# Altium footprint library CI.PcbLib: 42 footprints (part 3 of 3)
Each footprint in its own frame and in the unit in brackets; x right, y up, seen from the top. Pads: shape width x height; smd on the part's side, far side on the other; paste and mask are expansions set on the pad; w line width, h text height; cw(c..) or ccw(c..) is an arc to the next point about the centre after c.
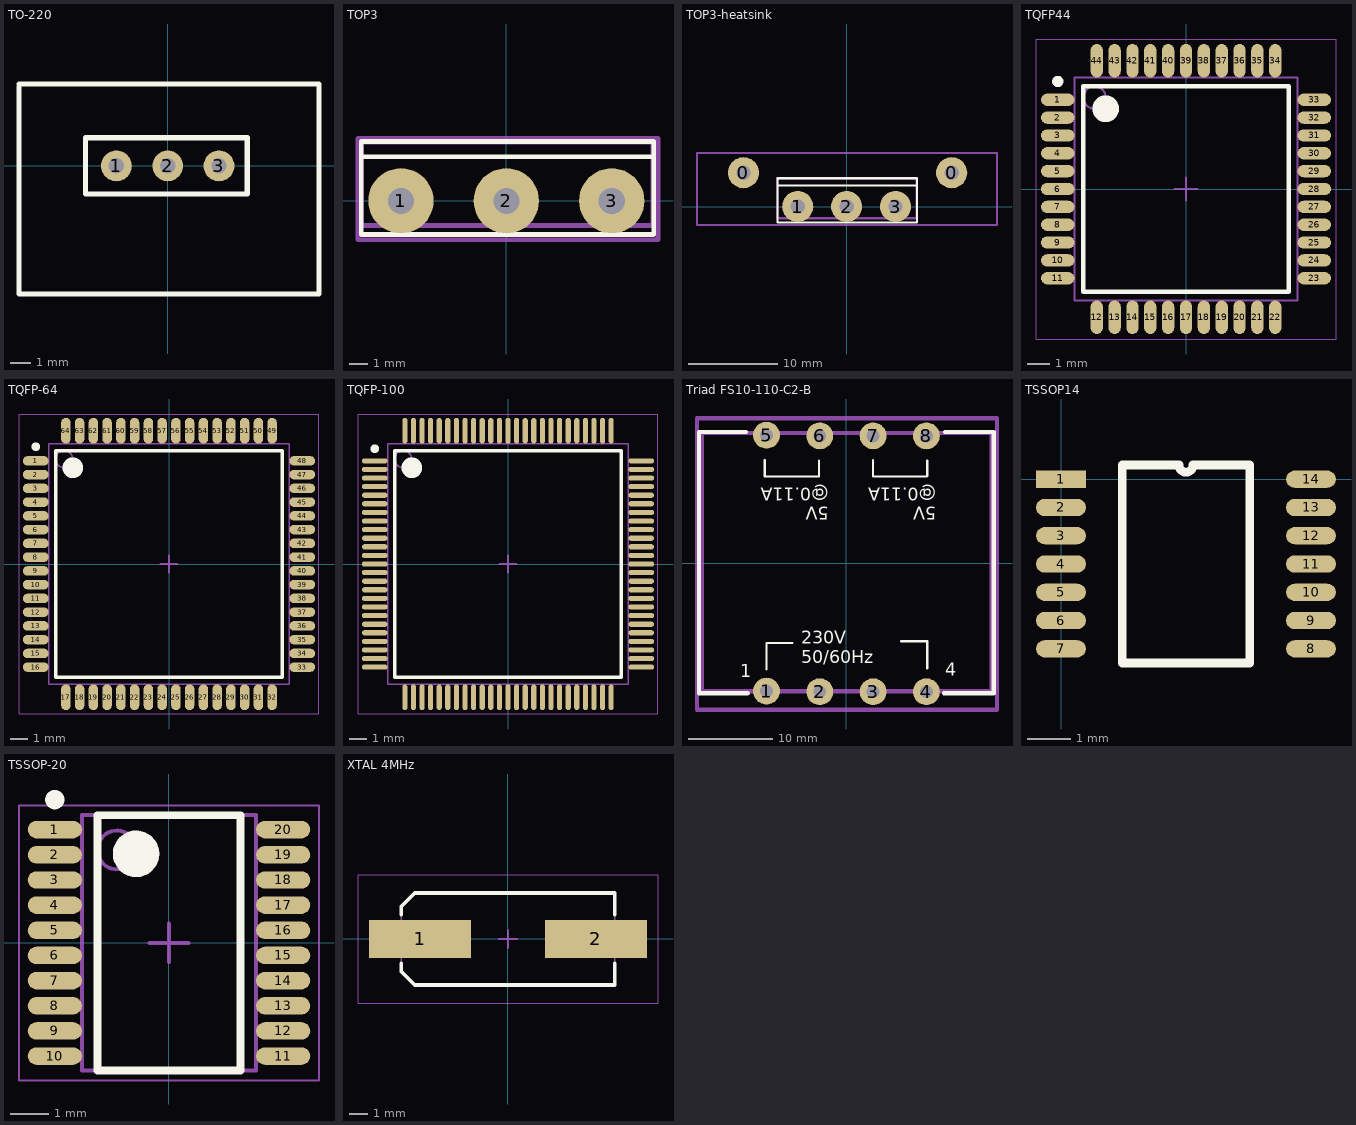
[diagram p2: the footprints below, top view; thin cyan lines are the x and y axes]

## TO-220 [mil] "TO-220 with Heatsink"
pads (3):
  round 60 hole 30: 1(-100,0) 2(0,0) 3(100,0)
Top Overlay:
  lines w10: -290,155 -290,-250 295,-250 295,160 -290,160 ; -160,-55 -160,55 155,55 155,-55 -160,-55
3D body: height 847.44, standoff 97.44, extent -292.96,-248.11 292.96,160
3D body: height 770.09, standoff -363.77, extent -200.79,-70 200.79,107.17

## TOP3 [mm] "TOP3 insulated"
pads (3):
  round 3.5 hole 1.4: 1(-5.65,0) 2(0,0) 3(5.65,0)
Top Overlay:
  lines w0.254: -7.772,2.362 7.899,2.362 ; -7.772,-1.803 7.899,-1.803 7.899,3.175 -7.772,3.175 -7.772,-1.803
Mechanical 13:
  lines w0.254: -7.798,3.15 7.849,3.15 7.849,-1.321 -7.772,-1.321 -7.772,3.124
Mechanical 15:
  lines w0.254: -7.95,-2.083 8.128,-2.083 8.128,3.353 -7.95,3.353 -7.95,-2.083
3D body: height 22.9, standoff -13, extent -7.801,-1.3 7.699,3.2

## TOP3-heatsink [mm] "TOP3 insulated with medium heatsink"
pads (5):
  round 3.5 hole 1.6: 0(-11.601,3.799) 0(11.799,3.799) 1(-5.5,0) 2(0,0) 3(5.5,0)
Top Overlay:
  lines w0.254: -7.772,2.362 7.899,2.362 ; -7.772,-1.803 -7.772,3.175 7.899,3.175 7.899,-1.803 -7.772,-1.803
Mechanical 13:
  lines w0.254: -7.798,3.15 7.849,3.15 7.849,-1.321 -7.772,-1.321 -7.772,3.124
Mechanical 15:
  lines w0.254: -16.815,-2.083 -16.815,6.02 16.891,6.02 16.891,-2.083 -16.815,-2.083
3D body: height 25.2, standoff -12.7, extent -16.823,-2.001 16.977,9.599

## TQFP44 [mm] "TQFP, 44-Leads, Body 10.00x10.00mm, Pitch 0.80mm, IPC Medium Density"
height 1.2
pads (44):
  oval 1.5x0.55 smd: 1(-5.75,4) 2(-5.75,3.2) 3(-5.75,2.4) 4(-5.75,1.6) 5(-5.75,0.8) 6(-5.75,0) 7(-5.75,-0.8) 8(-5.75,-1.6) 9(-5.75,-2.4) 10(-5.75,-3.2) 11(-5.75,-4) 23(5.75,-4) 24(5.75,-3.2) 25(5.75,-2.4) 26(5.75,-1.6) 27(5.75,-0.8) 28(5.75,0) 29(5.75,0.8) 30(5.75,1.6) 31(5.75,2.4) 32(5.75,3.2) 33(5.75,4)
  oval 0.55x1.5 smd: 12(-4,-5.75) 13(-3.2,-5.75) 14(-2.4,-5.75) 15(-1.6,-5.75) 16(-0.8,-5.75) 17(0,-5.75) 18(0.8,-5.75) 19(1.6,-5.75) 20(2.4,-5.75) 21(3.2,-5.75) 22(4,-5.75) 34(4,5.75) 35(3.2,5.75) 36(2.4,5.75) 37(1.6,5.75) 38(0.8,5.75) 39(0,5.75) 40(-0.8,5.75) 41(-1.6,5.75) 42(-2.4,5.75) 43(-3.2,5.75) 44(-4,5.75)
Top Overlay:
  circle w0.25: c-5.75,4.825 r0.125
  circle w0.6: c-3.6,3.6 r0.3
  lines w0.2: -4.6,-4.6 -4.6,4.6 4.6,4.6 4.6,-4.6 -4.6,-4.6
Mechanical 13:
  circle w0.1: c-4.1,4.1 r0.5
  lines w0.1: -5,-5 -5,5 5,5 5,-5 -5,-5
Mechanical 15:
  lines w0.05: -6.725,-6.725 -6.725,6.725 6.725,6.725 6.725,-6.725 -6.725,-6.725
  lines w0.1: -0.5,0 0.5,0 ; 0,-0.5 0,0.5
3D body: height 1.1, standoff 0, extent -6.025,-6.006 5.975,5.994

## TQFP-64 [mm] "64-lead, 14 x 14mm Body Size, 1.0mm Body Thickness,  0.8mm Lead Pitch, Thin Profile Plastic Quad Flat Package (TQFP)"
height 1.2
pads (64):
  oval 1.5x0.55 smd: 1(-7.75,6) 2(-7.75,5.2) 3(-7.75,4.4) 4(-7.75,3.6) 5(-7.75,2.8) 6(-7.75,2) 7(-7.75,1.2) 8(-7.75,0.4) 9(-7.75,-0.4) 10(-7.75,-1.2) 11(-7.75,-2) 12(-7.75,-2.8) 13(-7.75,-3.6) 14(-7.75,-4.4) 15(-7.75,-5.2) 16(-7.75,-6) 33(7.75,-6) 34(7.75,-5.2) 35(7.75,-4.4) 36(7.75,-3.6) 37(7.75,-2.8) 38(7.75,-2) 39(7.75,-1.2) 40(7.75,-0.4) 41(7.75,0.4) 42(7.75,1.2) 43(7.75,2) 44(7.75,2.8) 45(7.75,3.6) 46(7.75,4.4) 47(7.75,5.2) 48(7.75,6)
  oval 0.55x1.5 smd: 17(-6,-7.75) 18(-5.2,-7.75) 19(-4.4,-7.75) 20(-3.6,-7.75) 21(-2.8,-7.75) 22(-2,-7.75) 23(-1.2,-7.75) 24(-0.4,-7.75) 25(0.4,-7.75) 26(1.2,-7.75) 27(2,-7.75) 28(2.8,-7.75) 29(3.6,-7.75) 30(4.4,-7.75) 31(5.2,-7.75) 32(6,-7.75) 49(6,7.75) 50(5.2,7.75) 51(4.4,7.75) 52(3.6,7.75) 53(2.8,7.75) 54(2,7.75) 55(1.2,7.75) 56(0.4,7.75) 57(-0.4,7.75) 58(-1.2,7.75) 59(-2,7.75) 60(-2.8,7.75) 61(-3.6,7.75) 62(-4.4,7.75) 63(-5.2,7.75) 64(-6,7.75)
Top Overlay:
  circle w0.6: c-5.6,5.6 r0.3
  circle w0.25: c-7.75,6.825 r0.125
  lines w0.2: -6.6,-6.6 6.6,-6.6 6.6,6.6 -6.6,6.6 -6.6,-6.6
Mechanical 13:
  circle w0.1: c-6.1,6.1 r0.5
  lines w0.1: -7,-7 7,-7 7,7 -7,7 -7,-7
Mechanical 15:
  lines w0.05: -8.725,-8.725 8.725,-8.725 8.725,8.725 -8.725,8.725 -8.725,-8.725
  lines w0.1: -0.5,0 0.5,0 ; 0,-0.5 0,0.5
3D body: height 1.35, standoff -0.01, extent -8.128,-8.103 8.121,8.146

## TQFP-100 [mm] "100-lead, 14 x 14 mm Body Size, 1.0 mm Body Thickness,  0.5 mm Lead Pitch, Thin Profile Plastic Quad Flat Package (TQFP)"
height 1.2
pads (100):
  oval 1.5x0.3 smd: 1(-7.75,6) 2(-7.75,5.5) 3(-7.75,5) 4(-7.75,4.5) 5(-7.75,4) 6(-7.75,3.5) 7(-7.75,3) 8(-7.75,2.5) 9(-7.75,2) 10(-7.75,1.5) 11(-7.75,1) 12(-7.75,0.5) 13(-7.75,0) 14(-7.75,-0.5) 15(-7.75,-1) 16(-7.75,-1.5) 17(-7.75,-2) 18(-7.75,-2.5) 19(-7.75,-3) 20(-7.75,-3.5) 21(-7.75,-4) 22(-7.75,-4.5) 23(-7.75,-5) 24(-7.75,-5.5) 25(-7.75,-6) 51(7.75,-6) 52(7.75,-5.5) 53(7.75,-5) 54(7.75,-4.5) 55(7.75,-4) 56(7.75,-3.5) 57(7.75,-3) 58(7.75,-2.5) 59(7.75,-2) 60(7.75,-1.5) 61(7.75,-1) 62(7.75,-0.5) 63(7.75,0) 64(7.75,0.5) 65(7.75,1) 66(7.75,1.5) 67(7.75,2) 68(7.75,2.5) 69(7.75,3) 70(7.75,3.5) 71(7.75,4) 72(7.75,4.5) 73(7.75,5) 74(7.75,5.5) 75(7.75,6)
  oval 0.3x1.5 smd: 26(-6,-7.75) 27(-5.5,-7.75) 28(-5,-7.75) 29(-4.5,-7.75) 30(-4,-7.75) 31(-3.5,-7.75) 32(-3,-7.75) 33(-2.5,-7.75) 34(-2,-7.75) 35(-1.5,-7.75) 36(-1,-7.75) 37(-0.5,-7.75) 38(0,-7.75) 39(0.5,-7.75) 40(1,-7.75) 41(1.5,-7.75) 42(2,-7.75) 43(2.5,-7.75) 44(3,-7.75) 45(3.5,-7.75) 46(4,-7.75) 47(4.5,-7.75) 48(5,-7.75) 49(5.5,-7.75) 50(6,-7.75) 76(6,7.75) 77(5.5,7.75) 78(5,7.75) 79(4.5,7.75) 80(4,7.75) 81(3.5,7.75) 82(3,7.75) 83(2.5,7.75) 84(2,7.75) 85(1.5,7.75) 86(1,7.75) 87(0.5,7.75) 88(0,7.75) 89(-0.5,7.75) 90(-1,7.75) 91(-1.5,7.75) 92(-2,7.75) 93(-2.5,7.75) 94(-3,7.75) 95(-3.5,7.75) 96(-4,7.75) 97(-4.5,7.75) 98(-5,7.75) 99(-5.5,7.75) 100(-6,7.75)
Top Overlay:
  circle w0.6: c-5.6,5.6 r0.3
  circle w0.25: c-7.75,6.7 r0.125
  lines w0.2: -6.6,-6.6 6.6,-6.6 6.6,6.6 -6.6,6.6 -6.6,-6.6
Mechanical 13:
  circle w0.1: c-6.1,6.1 r0.5
  lines w0.1: -7,-7 7,-7 7,7 -7,7 -7,-7
Mechanical 15:
  lines w0.05: -8.725,-8.725 8.725,-8.725 8.725,8.725 -8.725,8.725 -8.725,-8.725
  lines w0.1: -0.5,0 0.5,0 ; 0,-0.5 0,0.5
3D body: height 1.1, standoff 0, extent -8.008,-8.009 8.009,8.009

## Triad FS10-110-C2-B [mm] "Triad Magnetics Class 2 Transformer LAMINATED 1.1VA THRU HOLE"
pads (8):
  round 3.2 hole 1.524: 1(-9.525,-15.202) 2(-3.175,-15.278) 3(3.175,-15.278) 4(9.525,-15.278) 5(-9.525,15.278) 6(-3.175,15.202) 7(3.175,15.202) 8(9.525,15.202)
Top Overlay:
  lines w0.254: -9.728,12.306 -9.728,10.376 -3.302,10.376 -3.277,10.401 -3.277,12.281 ; -9.525,-12.611 -9.525,-9.461 -6.426,-9.461 ; 3.175,12.306 3.175,10.376 9.601,10.376 ; 6.477,-9.258 9.627,-9.258 9.627,-9.868 9.627,-12.509 ; 9.627,10.401 9.627,12.281
  lines w0.5: -11.963,15.659 -17.577,15.659 -17.577,-15.456 -11.76,-15.456 ; 11.608,-15.456 17.551,-15.456 17.551,15.659 11.735,15.659
  text "230V / 50/60Hz" at -5.41,-11.874 h1.52
  text "5V / @0.11A" at -2.134,9.03 h1.52
  text "5V / @0.11A" at 10.668,9.03 h1.52
  text "1" at -12.649,-13.525 h1.52
  text "4" at 11.786,-13.399 h1.52
Mechanical 13:
  lines w0.5: -17.247,15.557 17.272,15.557 17.272,-15.227 -17.247,-15.227 -17.247,15.608
Mechanical 15:
  lines w0.5: -17.805,-17.437 17.932,-17.437 17.932,17.31 -17.805,17.31 -17.805,-17.437
3D body: height 23.8, standoff -5.94, extent -17.463,-15.38 17.488,15.608

## TSSOP14 [mm]
pads (14):
  rect 1.15x0.394 smd: 1(0,0)
  oval 1.15x0.394 smd: 2(0,-0.65) 3(0,-1.3) 4(0,-1.95) 5(0,-2.6) 6(0,-3.25) 7(0,-3.9) 8(5.75,-3.9) 9(5.75,-3.25) 10(5.75,-2.6) 11(5.75,-1.95) 12(5.75,-1.3) 13(5.75,-0.65) 14(5.75,0)
Top Overlay:
  lines w0.2: 1.41,-4.225 1.41,0.325 2.713,0.325 ccw(c2.875,0.325) 3.037,0.325 4.34,0.325 4.34,-4.225 1.41,-4.225
3D body: height 1.1, standoff 0, extent -0.355,-4.456 6.045,0.544

## TSSOP-20 [mm] "TSOP, 20-Leads, Body 6,50x4,40mm, Pitch 0,65mm, IPC Medium Density"
height 1.1
pads (20):
  oval 1.4x0.45 smd: 1(-2.95,2.925) 2(-2.95,2.275) 3(-2.95,1.625) 4(-2.95,0.975) 5(-2.95,0.325) 6(-2.95,-0.325) 7(-2.95,-0.975) 8(-2.95,-1.625) 9(-2.95,-2.275) 10(-2.95,-2.925) 11(2.95,-2.925) 12(2.95,-2.275) 13(2.95,-1.625) 14(2.95,-0.975) 15(2.95,-0.325) 16(2.95,0.325) 17(2.95,0.975) 18(2.95,1.625) 19(2.95,2.275) 20(2.95,2.925)
Top Overlay:
  circle w0.6: c-0.85,2.3 r0.3
  circle w0.25: c-2.95,3.7 r0.125
  lines w0.2: -1.85,-3.3 1.85,-3.3 1.85,3.3 -1.85,3.3 -1.85,-3.3
Mechanical 13:
  circle w0.1: c-1.35,2.4 r0.5
  lines w0.1: -2.25,-3.3 2.25,-3.3 2.25,3.3 -2.25,3.3 -2.25,-3.3
Mechanical 15:
  lines w0.05: -3.875,-3.55 3.875,-3.55 3.875,3.55 -3.875,3.55 -3.875,-3.55
  lines w0.1: -0.5,0 0.5,0 ; 0,-0.5 0,0.5
3D body: height 1.09, standoff 0, extent -3.089,-3.35 3.191,3.15

## XTAL 4MHz [mm] "Low Profile SMD Crystal"
height 4.5
pads (2):
  rect 5.55x2.05 smd: 1(-4.775,0) 2(4.775,0)
Top Overlay:
  lines w0.2: -5.8,-1.325 -5.8,-1.763 -5.062,-2.5 5.8,-2.5 5.8,-1.325 ; -5.8,1.325 -5.8,1.762 -5.062,2.5 5.8,2.5 5.8,1.325
Mechanical 13:
  lines w0.1: -5.8,-1.763 -5.062,-2.5 5.8,-2.5 5.8,2.5 -5.062,2.5 -5.8,1.762 -5.8,-1.763
Mechanical 15:
  lines w0.05: -8.15,-3.5 -8.15,3.5 8.15,3.5 8.15,-3.5 -8.15,-3.5
  lines w0.1: -0.5,0 0.5,0 ; 0,-0.5 0,0.5
3D body: height 3.92, standoff -0.08, extent -6.123,-2.387 6.377,2.413